# Altium footprint library DATN.PcbLib: 21 footprints (part 1 of 2)
Each footprint in its own frame and in the unit in brackets; x right, y up, seen from the top. Pads: shape width x height; smd on the part's side, far side on the other; paste and mask are expansions set on the pad; w line width, h text height; cw(c..) or ccw(c..) is an arc to the next point about the centre after c.
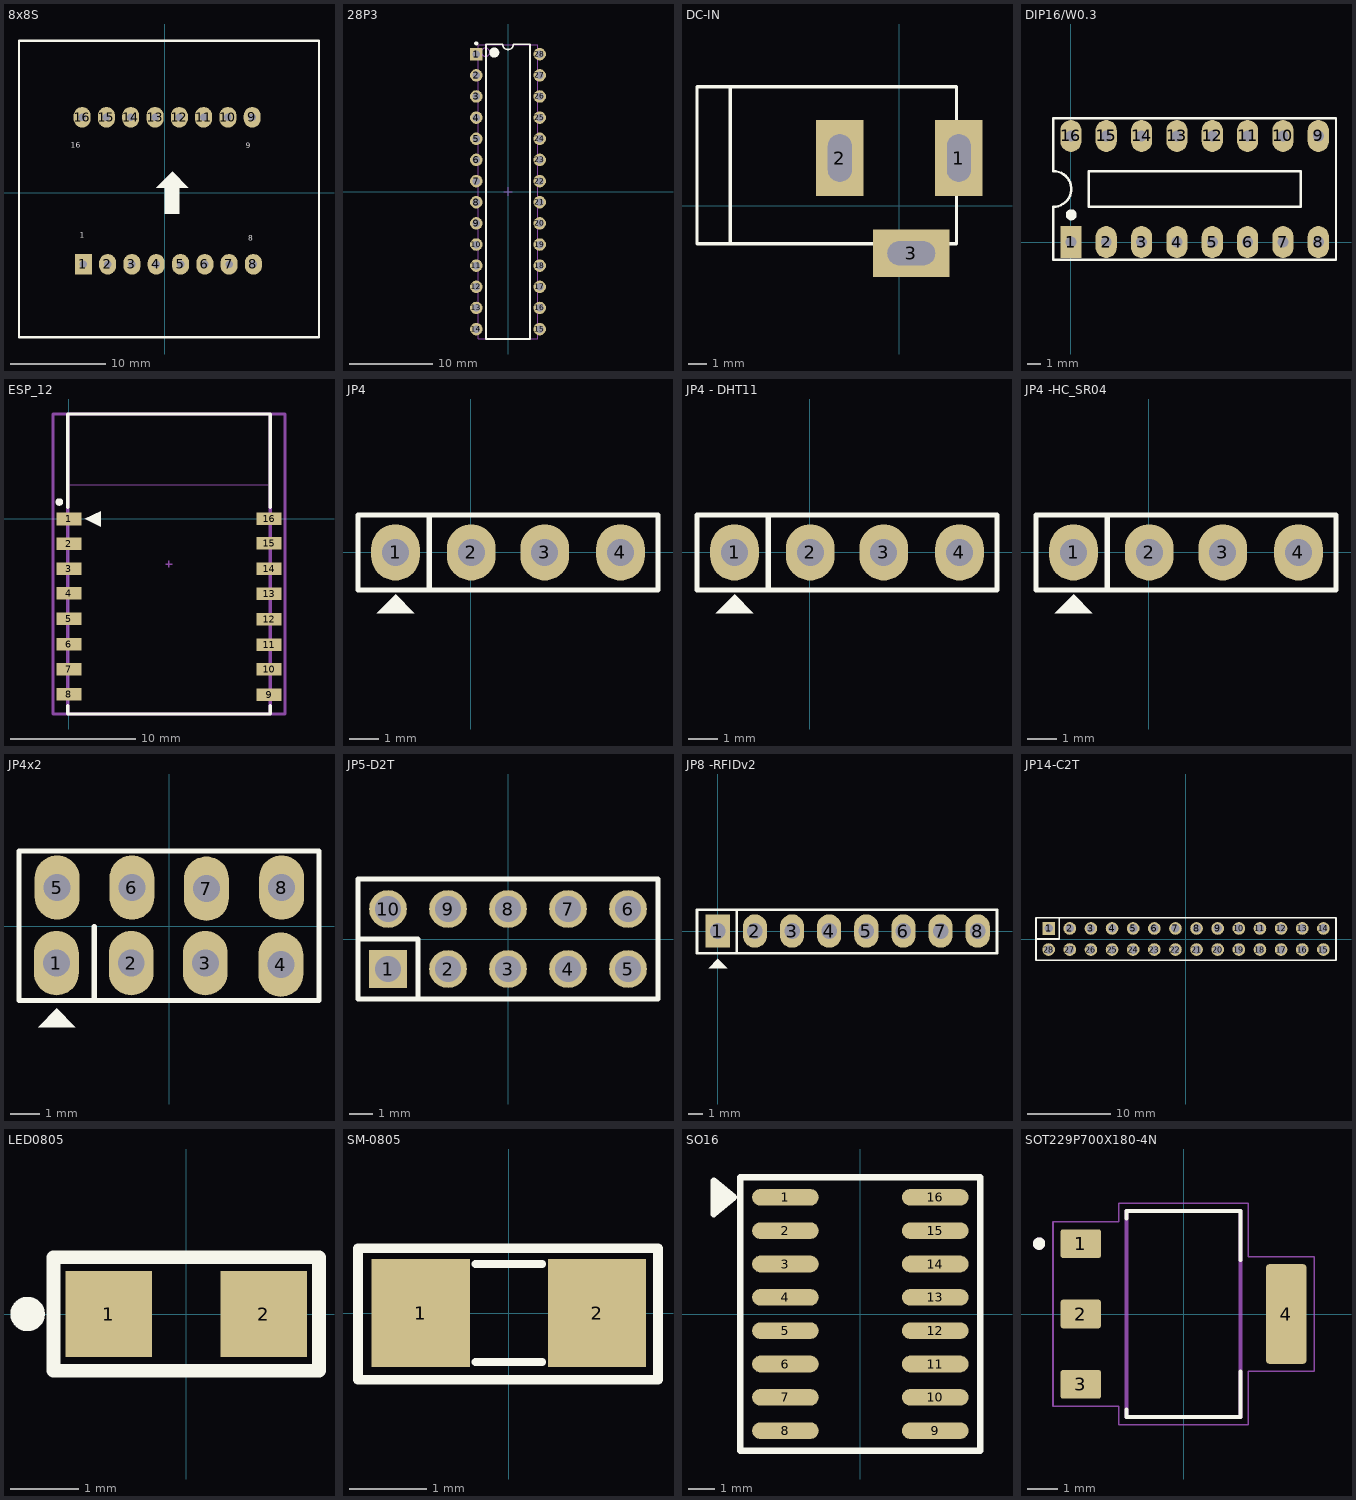
[diagram p0: the footprints below, top view; thin cyan lines are the x and y axes]

## 8x8S [mil]
pads (16):
  rect 70x85 hole 31: 1(-335,-295)
  oval 70x85 hole 31: 2(-235,-295) 3(-135,-295) 4(-35,-295) 5(65,-295) 6(165,-295) 7(265,-295) 8(365,-295) 9(360,310) 10(260,310) 11(160,310) 12(60,310) 13(-40,310) 14(-140,310) 15(-240,310) 16(-340,310)
Top Overlay:
  region: -36,20 30,86 32,86 97,21 97,20 60,20 60,-86 1,-86 1,20
  lines w10: -600,-595 -600,625 635,625 635,-595 -600,-595
  text "16" at -387,176 h39.37
  text "9" at 334,175 h39.37
  text "8" at 343,-206 h39.37
  text "1" at -350,-194 h39.37
3D body "User Library-LED matrix 1_9mm.step": height 354.33, standoff -118.11, extent -377.4,-378.7 410,408.7

## 28P3 [mm]
pads (28):
  rect 1.5x1.5 hole 0.9: 1(-3.81,16.51)
  round 1.5 hole 0.9: 2(-3.81,13.97) 3(-3.81,11.43) 4(-3.81,8.89) 5(-3.81,6.35) 6(-3.81,3.81) 7(-3.81,1.27) 8(-3.81,-1.27) 9(-3.81,-3.81) 10(-3.81,-6.35) 11(-3.81,-8.89) 12(-3.81,-11.43) 13(-3.81,-13.97) 14(-3.81,-16.51) 15(3.81,-16.51) 16(3.81,-13.97) 17(3.81,-11.43) 18(3.81,-8.89) 19(3.81,-6.35) 20(3.81,-3.81) 21(3.81,-1.27) 22(3.81,1.27) 23(3.81,3.81) 24(3.81,6.35) 25(3.81,8.89) 26(3.81,11.43) 27(3.81,13.97) 28(3.81,16.51)
Top Overlay:
  circle w0.6: c-1.65,16.7 r0.3
  circle w0.25: c-3.81,17.81 r0.125
  lines w0.2: -2.65,-17.7 2.65,-17.7 2.65,17.7 0.635,17.7 cw(c0,17.7) -0.635,17.7 -2.65,17.7 -2.65,-17.7
Mechanical 13:
  circle w0.1: c-2.7,16.75 r0.5
  lines w0.1: -3.6,-17.65 3.6,-17.65 3.6,17.65 -3.6,17.65 -3.6,-17.65
Mechanical 15:
  lines w0.1: -0.5,0 0.5,0 ; 0,-0.5 0,0.5
3D body: height 4.58, standoff 0, extent -3.6,-17.65 3.6,17.65

## DC-IN [mil]
pads (3):
  rect 100x160 hole 50 slot 100 at 90 deg: 1(125,100) 2(-125,100)
  rect 160x100 hole 50 slot 100 at 0 deg: 3(25,-100)
Top Overlay:
  lines w7: -355,-80 -355,250 ; -425,-80 120,-80 120,250 -425,250 -425,-80
3D body "SW3dPS-dc range - dc connector[4840.2201].STEP": height 433.67, standoff -137.2, extent -410.35,-105.12 134,269.12

## DIP16/W0.3 [mil]
pads (16):
  rect 60x90 hole 31: 1(0,0)
  oval 60x90 hole 31: 2(100,0) 3(200,0) 4(300,0) 5(400,0) 6(500,0) 7(600,0) 8(700,0) 9(700,300) 10(600,300) 11(500,300) 12(400,300) 13(300,300) 14(200,300) 15(100,300) 16(0,300)
Top Overlay:
  circle w15: c1,77 r8
  lines w7: -50.38,100.05 ccw(c-48.69,150.02) -50,200 ; -50,100 -50,-50 750,-50 750,350 -49,350 -50,349 ; -50,201 -50,350 ; 50,100 50,200 650,200 650,100 50,100
3D body "SW3dPS-DIP 16 _ socket 214.STEP": height 299.42, standoff -131.12, extent -51.7,-57.39 751.69,356

## ESP_12 [mm]
pads (16):
  rect 2x1 smd: 1(0,0) 2(0,-1.97) 3(0,-3.97) 4(0,-5.94) 5(0,-7.98) 6(0,-9.99) 7(0,-11.98) 8(0,-13.99) 9(16,-14.03) 10(16,-11.99) 11(16,-10.03) 12(16,-8.01) 13(16,-5.95) 14(16,-3.97) 15(16,-1.95) 16(16,0.03)
Top Overlay:
  circle w0.3: c-0.762,1.356 r0.15
  region: 1.27,0 2.54,-0.635 2.54,0.635
  lines w0.254: -0.084,-14.916 -0.084,-15.568 16.084,-15.568 16.084,-14.916 ; -0.084,0.916 -0.084,8.371 16.084,8.371 16.084,0.916
Mechanical 13:
  lines w0.051: -0.127,2.727 16.129,2.727 16.129,8.382 -0.127,8.382 -0.127,2.727
  lines w0.254: -0.084,-15.568 -0.084,8.371 16.084,8.371 16.084,-15.568 -0.084,-15.568
  text "ANTENNA AREA" at 0.127,7.874 h0.25
  text "CUTOUT POLYGON" at 0.127,7.366 h0.25
Mechanical 15:
  lines w0.1: 7.746,-3.598 8.254,-3.598 ; 8,-3.852 8,-3.344
  lines w0.254: -1.27,-15.568 17.272,-15.568 17.272,8.371 -1.27,8.371 -1.27,-15.568
3D body "ESP-12F.STEP": height 3.15, standoff -0.02, extent 0.001,-15.556 16.001,8.444

## JP4 [mil]
pads (4):
  oval 65x75 hole 36: 1(-100,0) 2(1,0) 3(99,0) 4(200,0)
Top Overlay:
  region: -100,-56 -125,-81 -75,-81
  lines w7: -55,-50 -55,49 ; -150,-50 250,-50 250,50 -150,50 -150,-50
3D body "OLED TFT 0.96 inch 64x128 monochrome.STEP": height 165.35, standoff -318.9, extent -487.4,-1034.49 587.41,60

## JP4 - DHT11 [mil]
pads (4):
  oval 65x75 hole 36: 1(-100,0) 2(1,0) 3(99,0) 4(200,0)
Top Overlay:
  region: -100,-56 -125,-81 -75,-81
  lines w7: -55,-50 -55,49 ; -150,-50 250,-50 250,50 -150,50 -150,-50
3D body "DHT11.STEP": height 610.74, standoff -314.46, extent -186.22,-105 286.22,111.53

## JP4 -HC_SR04 [mil]
pads (4):
  oval 65x75 hole 36: 1(-100,0) 2(1,0) 3(99,0) 4(200,0)
Top Overlay:
  region: -100,-56 -125,-81 -75,-81
  lines w7: -55,-50 -55,49 ; -150,-50 -150,50 250,50 250,-50 -150,-50
3D body "HC-SR04.STEP": height 214.57, standoff -799.21, extent -834.76,-719.68 944.77,10.64

## JP4x2 [mil]
pads (8):
  oval 60x86 hole 36: 1(-150.5,-49.5) 2(-50.5,-49.5) 3(48.5,-49.5) 4(149.5,-51.5) 5(-149.5,51.5) 6(-49.5,51.5) 7(50,50) 8(150.5,51.5)
Top Overlay:
  region: -150,-110 -175,-135 -125,-135
  lines w7: -100,-99 -100,-1 ; -200.5,-99.5 200.5,-99.5 200.5,100.5 -200.5,100.5 -200.5,0.5 -200.5,-99.5
3D body "JP2-4.stp": height 335.25, standoff -117.51, extent -196.99,-99.99 203.01,100.01

## JP5-D2T [mm]
pads (10):
  rect 1.6x1.6 hole 1.1: 1(-5.08,-1.27)
  round 1.6 hole 1.1: 2(-2.54,-1.27) 3(0,-1.27) 4(2.54,-1.27) 5(5.08,-1.27) 6(5.08,1.27) 7(2.54,1.27) 8(0,1.27) 9(-2.54,1.27) 10(-5.08,1.27)
Top Overlay:
  lines w0.2: -6.35,0 -3.81,0 -3.81,-2.54 ; -6.35,-2.54 6.35,-2.54 6.35,2.54 -1.27,2.54 -6.35,2.54 -6.35,-2.54
3D body "61301021121.stp": height 8.55, standoff -2.99, extent -6.35,-2.54 6.35,2.54

## JP8 -RFIDv2 [mil]
pads (8):
  rect 65x90 hole 42: 1(0,0)
  oval 65x90 hole 42: 2(100,0) 3(200,0) 4(300,0) 5(400,0) 6(500,0) 7(600,0) 8(700,0)
Top Overlay:
  region: 0,-75 -25,-100 25,-100
  lines w7: 51,-60 51,56 ; -56,-60 -56,57 752,57 752,-60 -56,-60
3D body "RC522 v8.step": height 210.99, standoff -295.28, extent -400,-90 1137.79,2255.67

## JP14-C2T [mm]
pads (28):
  rect 1.52x1.52 hole 1.02: 1(-16.51,1.27)
  round 1.52 hole 1.02: 2(-13.97,1.27) 3(-11.43,1.27) 4(-8.89,1.27) 5(-6.35,1.27) 6(-3.81,1.27) 7(-1.27,1.27) 8(1.27,1.27) 9(3.81,1.27) 10(6.35,1.27) 11(8.89,1.27) 12(11.43,1.27) 13(13.97,1.27) 14(16.51,1.27) 15(16.51,-1.27) 16(13.97,-1.27) 17(11.43,-1.27) 18(8.89,-1.27) 19(6.35,-1.27) 20(3.81,-1.27) 21(1.27,-1.27) 22(-1.27,-1.27) 23(-3.81,-1.27) 24(-6.35,-1.27) 25(-8.89,-1.27) 26(-11.43,-1.27) 27(-13.97,-1.27) 28(-16.51,-1.27)
Top Overlay:
  lines w0.2: -18.03,0 -15.24,0 -15.24,2.54 ; -18.03,-2.54 18.03,-2.54 18.03,2.54 -18.03,2.54 -18.03,-2.54
3D body "61302821821.stp": height 8.51, standoff -3.09, extent -18.03,-2.54 18.03,2.54

## LED0805 [mil]
pads (2):
  rect 50x50 smd: 1(-45,0) 2(45,0)
Top Overlay:
  circle w10: c-92,0 r5
  lines w7.87: 77,32 77,-33 -77,-33 -77,33 77,33
3D body: height 19.68, standoff 0, extent -60,-25 60,25
3D body: height 47.24, standoff 19.68, extent -35,-25 35,25

## SM-0805 [mil]
pads (2):
  rect 50x55 smd: 1(-45,0) 2(45,0)
Top Overlay:
  lines w4: -17,-25 17,-25 ; -17,25 17,25
  lines w5: -77,-34 -77,33 76,33 76,-34 -77,-34
3D body "SW3dPS-smt_resistor_packages.STEP": height 24.02, standoff -0.39, extent -39.76,-27 39.77,23

## SO16 [mil]
pads (16):
  oval 100x25 smd: 1(-112.36,175) 2(-112.36,125) 3(-112.36,75) 4(-112.36,25) 5(-112.36,-25) 6(-112.36,-75) 7(-112.36,-125) 8(-112.36,-175) 9(112.36,-175) 10(112.36,-125) 11(112.36,-75) 12(112.36,-25) 13(112.36,25) 14(112.36,75) 15(112.36,125) 16(112.36,175)
Top Overlay:
  region: -190,175 -220,200 -220,150
  lines w10: -220,150 -220,200 -190,175 -220,150 ; -180,-205 -180,205 180,205 180,-205 -180,-205
3D body: height 68.9, standoff 0, extent -76.77,-194.88 76.77,194.88
3D body: height 7.87, standoff 0, extent -136.8,165.5 -109.4,184.9
3D body: height 35.43, standoff 0, extent -109.4,165.5 -96.6,184.9
3D body: height 35.43, standoff 27.56, extent -96.6,165.5 -55.7,184.9
3D body: height 35.43, standoff 27.56, extent -96.6,115.5 -55.7,134.9
3D body: height 35.43, standoff 0, extent -109.4,115.5 -96.6,134.9
3D body: height 7.87, standoff 0, extent -136.8,115.5 -109.4,134.9
3D body: height 7.87, standoff 0, extent -136.8,15.5 -109.4,34.9
3D body: height 35.43, standoff 0, extent -109.4,15.5 -96.6,34.9
3D body: height 35.43, standoff 27.56, extent -96.6,15.5 -55.7,34.9
3D body: height 35.43, standoff 27.56, extent -96.6,65.5 -55.7,84.9
3D body: height 35.43, standoff 0, extent -109.4,65.5 -96.6,84.9
3D body: height 7.87, standoff 0, extent -136.8,65.5 -109.4,84.9
3D body: height 7.87, standoff 0, extent -136.8,-84.5 -109.4,-65.1
3D body: height 35.43, standoff 0, extent -109.4,-84.5 -96.6,-65.1
3D body: height 35.43, standoff 27.56, extent -96.6,-84.5 -55.7,-65.1
3D body: height 35.43, standoff 27.56, extent -96.6,-34.5 -55.7,-15.1
3D body: height 35.43, standoff 0, extent -109.4,-34.5 -96.6,-15.1
3D body: height 7.87, standoff 0, extent -136.8,-34.5 -109.4,-15.1
3D body: height 7.87, standoff 0, extent -136.8,-184.5 -109.4,-165.1
3D body: height 35.43, standoff 0, extent -109.4,-184.5 -96.6,-165.1
3D body: height 35.43, standoff 27.56, extent -96.6,-184.5 -55.7,-165.1
3D body: height 35.43, standoff 27.56, extent -96.6,-134.5 -55.7,-115.1
3D body: height 35.43, standoff 0, extent -109.4,-134.5 -96.6,-115.1
3D body: height 7.87, standoff 0, extent -136.8,-134.5 -109.4,-115.1
3D body: height 7.87, standoff 0, extent 109.4,115.1 136.8,134.5
3D body: height 35.43, standoff 0, extent 96.6,115.1 109.4,134.5
3D body: height 35.43, standoff 27.56, extent 55.7,115.1 96.6,134.5
3D body: height 35.43, standoff 27.56, extent 55.7,165.1 96.6,184.5
3D body: height 35.43, standoff 0, extent 96.6,165.1 109.4,184.5
3D body: height 7.87, standoff 0, extent 109.4,165.1 136.8,184.5
3D body: height 7.87, standoff 0, extent 109.4,15.1 136.8,34.5
3D body: height 35.43, standoff 0, extent 96.6,15.1 109.4,34.5
3D body: height 35.43, standoff 27.56, extent 55.7,15.1 96.6,34.5
3D body: height 35.43, standoff 27.56, extent 55.7,65.1 96.6,84.5
3D body: height 35.43, standoff 0, extent 96.6,65.1 109.4,84.5
3D body: height 7.87, standoff 0, extent 109.4,65.1 136.8,84.5
3D body: height 7.87, standoff 0, extent 109.4,-84.9 136.8,-65.5
3D body: height 35.43, standoff 0, extent 96.6,-84.9 109.4,-65.5
3D body: height 35.43, standoff 27.56, extent 55.7,-84.9 96.6,-65.5
3D body: height 35.43, standoff 27.56, extent 55.7,-34.9 96.6,-15.5
3D body: height 35.43, standoff 0, extent 96.6,-34.9 109.4,-15.5
3D body: height 7.87, standoff 0, extent 109.4,-34.9 136.8,-15.5
3D body: height 7.87, standoff 0, extent 109.4,-134.9 136.8,-115.5
3D body: height 35.43, standoff 0, extent 96.6,-134.9 109.4,-115.5
3D body: height 35.43, standoff 27.56, extent 55.7,-134.9 96.6,-115.5
3D body: height 35.43, standoff 27.56, extent 55.7,-184.9 96.6,-165.5
3D body: height 35.43, standoff 0, extent 96.6,-184.9 109.4,-165.5
3D body: height 7.87, standoff 0, extent 109.4,-184.9 136.8,-165.5

## SOT229P700X180-4N [mm]
pads (4):
  rrect15% 1.31x0.93 smd: 1(-3.345,2.29) 2(-3.345,0) 3(-3.345,-2.29)
  rrect15% 1.31x3.24 smd: 4(3.345,0)
Top Overlay:
  circle w0.2: c-4.703,2.29 r0.1
  lines w0.127: -1.86,-3.11 -1.86,-3.36 1.86,-3.36 1.86,-1.87 ; -1.86,3.1 -1.86,3.36 1.86,3.36 1.86,1.76
Mechanical 13:
  circle w0.2: c-4.703,2.29 r0.1
  lines w0.127: -1.86,-3.36 1.86,-3.36 1.86,3.36 -1.86,3.36 -1.86,-3.36
Mechanical 15:
  lines w0.05: -4.25,-3.01 -4.25,3.01 -2.11,3.01 -2.11,3.61 2.11,3.61 2.11,1.87 4.25,1.87 4.25,-1.87 2.11,-1.87 2.11,-3.61 -2.11,-3.61 -2.11,-3.01 -4.25,-3.01